# Altium footprint library 针式电感.PcbLib: 75 footprints (part 3 of 5)
Each footprint in its own frame and in the unit in brackets; x right, y up, seen from the top. Pads: shape width x height; smd on the part's side, far side on the other; paste and mask are expansions set on the pad; w line width, h text height; cw(c..) or ccw(c..) is an arc to the next point about the centre after c.
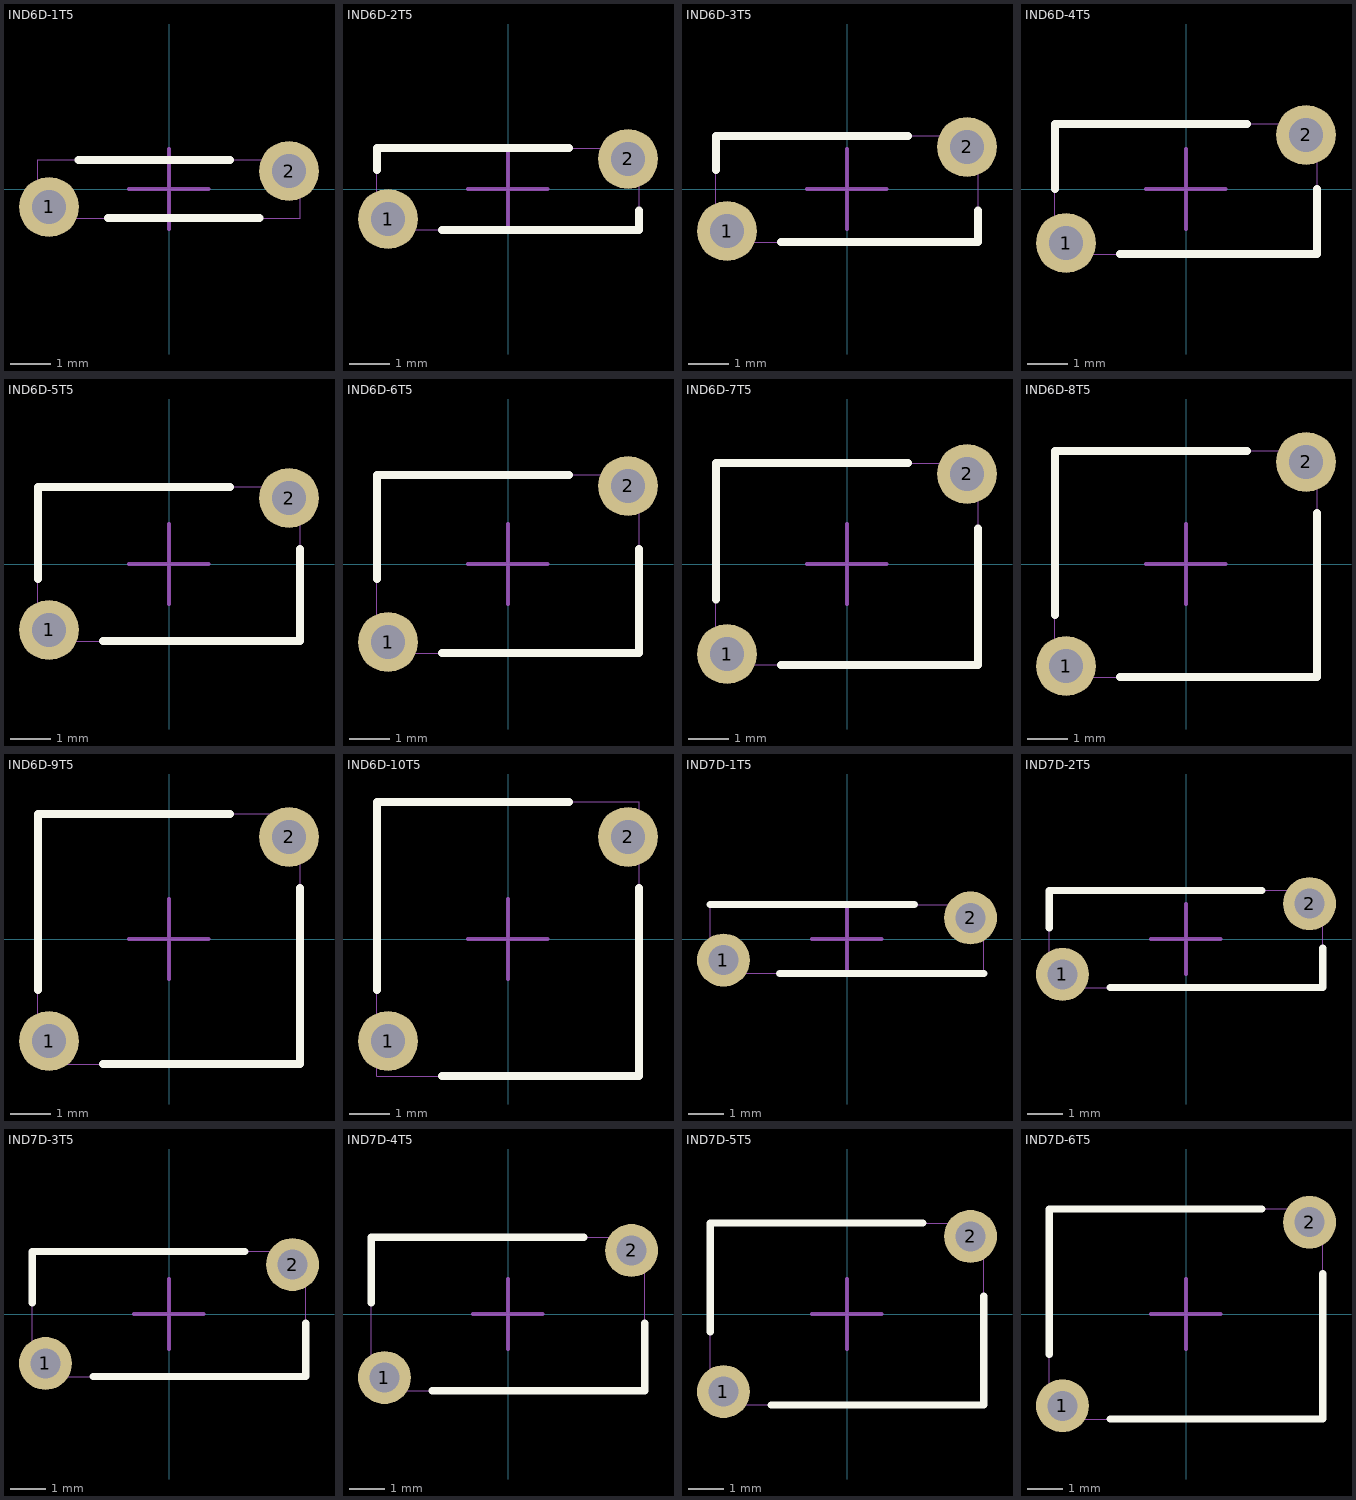
[diagram p2: the footprints below, top view; thin cyan lines are the x and y axes]

## IND6D-1T5 [mm] "空芯线圈"
height 6.8
pads (2):
  round 1.5 hole 0.85 unplated: 1(-3,-0.45) 2(3,0.45)
Top Overlay:
  lines w0.2: -2.264,0.725 1.524,0.725 ; -1.524,-0.725 2.264,-0.725
Mechanical 13:
  lines w0.01: -3.275,-0.725 3.275,-0.725 3.275,0.725 -3.275,0.725 -3.275,-0.725
Mechanical 15:
  lines w0.1: -1,0 0.991,0 ; 0,-1 0,1
3D body: height 6.77, standoff -2.5, extent -3.275,-0.725 3.275,0.725

## IND6D-2T5 [mm] "空芯线圈"
height 6.8
pads (2):
  round 1.5 hole 0.85 unplated: 1(-3,-0.75) 2(3,0.75)
Top Overlay:
  lines w0.2: -3.275,0.481 -3.275,1.025 1.524,1.025 ; -1.651,-1.025 3.275,-1.025 3.275,-0.535
Mechanical 13:
  lines w0.01: -3.275,-1.025 3.275,-1.025 3.275,1.025 -3.275,1.025 -3.275,-1.025
Mechanical 15:
  lines w0.1: -1,0 0.991,0 ; 0,-1 0,1
3D body: height 6.77, standoff -2.5, extent -3.275,-1.025 3.275,1.025

## IND6D-3T5 [mm] "空芯线圈"
height 6.8
pads (2):
  round 1.5 hole 0.85 unplated: 1(-3,-1.05) 2(3,1.05)
Top Overlay:
  lines w0.2: -3.275,0.481 -3.275,1.325 1.524,1.325 ; -1.651,-1.325 3.275,-1.325 3.275,-0.535
Mechanical 13:
  lines w0.01: -3.275,-1.325 -3.275,1.325 3.275,1.325 3.275,-1.325 -3.275,-1.325
Mechanical 15:
  lines w0.1: -1,0 0.991,0 ; 0,-1 0,1
3D body: height 6.78, standoff -2.5, extent -3.275,-1.325 3.275,1.325

## IND6D-4T5 [mm] "空芯线圈"
height 6.8
pads (2):
  round 1.5 hole 0.85 unplated: 1(-3,-1.35) 2(3,1.35)
Top Overlay:
  lines w0.2: -3.275,0 -3.275,1.625 1.524,1.625 ; -1.651,-1.625 3.275,-1.625 3.275,0
Mechanical 13:
  lines w0.01: -3.275,-1.625 -3.275,1.625 3.275,1.625 3.275,-1.625 -3.275,-1.625
Mechanical 15:
  lines w0.1: -1,0 0.991,0 ; 0,-1 0,1
3D body: height 6.78, standoff -2.5, extent -3.275,-1.625 3.275,1.625

## IND6D-5T5 [mm] "空芯线圈"
height 6.8
pads (2):
  round 1.5 hole 0.85 unplated: 1(-3,-1.65) 2(3,1.65)
Top Overlay:
  lines w0.2: -3.275,-0.381 -3.275,1.925 1.524,1.925 ; -1.651,-1.925 3.275,-1.925 3.275,0.381
Mechanical 13:
  lines w0.01: -3.275,-1.925 3.275,-1.925 3.275,1.925 -3.275,1.925 -3.275,-1.925
Mechanical 15:
  lines w0.1: -1,0 0.991,0 ; 0,-1 0,1
3D body: height 6.78, standoff -2.5, extent -3.275,-1.925 3.275,1.925

## IND6D-6T5 [mm] "空芯线圈"
height 6.8
pads (2):
  round 1.5 hole 0.85 unplated: 1(-3,-1.95) 2(3,1.95)
Top Overlay:
  lines w0.2: -3.275,-0.381 -3.275,2.225 1.524,2.225 ; -1.651,-2.225 3.275,-2.225 3.275,0.381
Mechanical 13:
  lines w0.01: -3.275,-2.225 3.275,-2.225 3.275,2.225 -3.275,2.225 -3.275,-2.225
Mechanical 15:
  lines w0.1: -1,0 0.991,0 ; 0,-1 0,1
3D body: height 6.78, standoff -2.5, extent -3.275,-2.225 3.275,2.225

## IND6D-7T5 [mm] "空芯线圈"
height 6.8
pads (2):
  round 1.5 hole 0.85 unplated: 1(-3,-2.25) 2(3,2.25)
Top Overlay:
  lines w0.2: -3.275,-0.889 -3.275,2.525 1.524,2.525 ; -1.651,-2.525 3.275,-2.525 3.275,0.889
Mechanical 13:
  lines w0.01: -3.275,-2.525 -3.275,2.525 3.275,2.525 3.275,-2.525 -3.275,-2.525
Mechanical 15:
  lines w0.1: -1,0 0.991,0 ; 0,-1 0,1
3D body: height 6.77, standoff -2.5, extent -3.275,-2.525 3.275,2.525

## IND6D-8T5 [mm] "空芯线圈"
height 6.8
pads (2):
  round 1.5 hole 0.85 unplated: 1(-3,-2.55) 2(3,2.55)
Top Overlay:
  lines w0.2: -3.275,-1.27 -3.275,2.825 1.524,2.825 ; -1.651,-2.825 3.275,-2.825 3.275,1.27
Mechanical 13:
  lines w0.01: -3.275,-2.825 -3.275,2.825 3.275,2.825 3.275,-2.825 -3.275,-2.825
Mechanical 15:
  lines w0.1: -1,0 0.991,0 ; 0,-1 0,1
3D body: height 6.77, standoff -2.5, extent -3.275,-2.825 3.275,2.825

## IND6D-9T5 [mm] "空芯线圈"
height 6.8
pads (2):
  round 1.5 hole 0.85 unplated: 1(-3,-2.55) 2(3,2.55)
Top Overlay:
  lines w0.2: -3.275,-1.27 -3.275,3.125 1.524,3.125 ; -1.651,-3.125 3.275,-3.125 3.275,1.27
Mechanical 13:
  lines w0.01: -3.275,-3.125 -3.275,3.125 3.275,3.125 3.275,-3.125 -3.275,-3.125
Mechanical 15:
  lines w0.1: -1,0 0.991,0 ; 0,-1 0,1
3D body: height 6.77, standoff -2.5, extent -3.275,-3.125 3.275,3.125

## IND6D-10T5 [mm] "空芯线圈"
height 6.8
pads (2):
  round 1.5 hole 0.85 unplated: 1(-3,-2.55) 2(3,2.55)
Top Overlay:
  lines w0.2: -3.275,-1.27 -3.275,3.425 1.524,3.425 ; -1.651,-3.425 3.275,-3.425 3.275,1.27
Mechanical 13:
  lines w0.01: -3.275,-3.425 -3.275,3.425 3.275,3.425 3.275,-3.425 -3.275,-3.425
Mechanical 15:
  lines w0.1: -1,0 0.991,0 ; 0,-1 0,1
3D body: height 6.78, standoff -2.5, extent -3.275,-3.425 3.275,3.425

## IND7D-1T5 [mm] "空芯线圈"
height 6.8
pads (2):
  round 1.5 hole 0.85 unplated: 1(-3.5,-0.6) 2(3.5,0.6)
Top Overlay:
  lines w0.2: -3.875,0.975 1.905,0.975 ; -1.905,-0.975 3.875,-0.975
Mechanical 13:
  lines w0.01: -3.875,-0.975 -3.875,0.975 3.875,0.975 3.875,-0.975 -3.875,-0.975
Mechanical 15:
  lines w0.1: -1,0 0.991,0 ; 0,-1 0,1
3D body: height 8.12, standoff -2.76, extent -3.875,-0.975 3.875,0.975

## IND7D-2T5 [mm] "空芯线圈"
height 6.8
pads (2):
  round 1.5 hole 0.85 unplated: 1(-3.5,-1) 2(3.5,1)
Top Overlay:
  lines w0.2: -3.875,0.319 -3.875,1.375 2.159,1.375 ; -2.159,-1.375 3.875,-1.375 3.875,-0.254
Mechanical 13:
  lines w0.01: -3.875,-1.375 -3.875,1.375 3.875,1.375 3.875,-1.375 -3.875,-1.375
Mechanical 15:
  lines w0.1: -1,0 0.991,0 ; 0,-1 0,1
3D body: height 8.12, standoff -2.76, extent -3.875,-1.375 3.875,1.375

## IND7D-3T5 [mm] "空芯线圈"
height 6.8
pads (2):
  round 1.5 hole 0.85 unplated: 1(-3.5,-1.4) 2(3.5,1.4)
Top Overlay:
  lines w0.2: -3.875,0.319 -3.875,1.775 2.159,1.775 ; -2.159,-1.775 3.875,-1.775 3.875,-0.254
Mechanical 13:
  lines w0.01: -3.875,-1.775 3.875,-1.775 3.875,1.775 -3.875,1.775 -3.875,-1.775
Mechanical 15:
  lines w0.1: -1,0 0.991,0 ; 0,-1 0,1
3D body: height 8.12, standoff -2.76, extent -3.875,-1.775 3.875,1.775

## IND7D-4T5 [mm] "空芯线圈"
height 6.8
pads (2):
  round 1.5 hole 0.85 unplated: 1(-3.5,-1.8) 2(3.5,1.8)
Top Overlay:
  lines w0.2: -3.875,0.319 -3.875,2.175 2.159,2.175 ; -2.159,-2.175 3.875,-2.175 3.875,-0.254
Mechanical 13:
  lines w0.01: -3.875,-2.175 -3.875,2.175 3.875,2.175 3.875,-2.175 -3.875,-2.175
Mechanical 15:
  lines w0.1: -1,0 0.991,0 ; 0,-1 0,1
3D body: height 8.13, standoff -2.76, extent -3.875,-2.175 3.875,2.175

## IND7D-5T5 [mm] "空芯线圈"
height 6.8
pads (2):
  round 1.5 hole 0.85 unplated: 1(-3.5,-2.2) 2(3.5,2.2)
Top Overlay:
  lines w0.2: -3.875,-0.508 -3.875,2.575 2.159,2.575 ; -2.159,-2.575 3.875,-2.575 3.875,0.508
Mechanical 13:
  lines w0.01: -3.875,-2.575 -3.875,2.575 3.875,2.575 3.875,-2.575 -3.875,-2.575
Mechanical 15:
  lines w0.1: -1,0 0.991,0 ; 0,-1 0,1
3D body: height 8.12, standoff -2.76, extent -3.875,-2.575 3.875,2.575

## IND7D-6T5 [mm] "空芯线圈"
height 6.8
pads (2):
  round 1.5 hole 0.85 unplated: 1(-3.5,-2.6) 2(3.5,2.6)
Top Overlay:
  lines w0.2: -3.875,-1.143 -3.875,2.975 2.159,2.975 ; -2.159,-2.975 3.875,-2.975 3.875,1.143
Mechanical 13:
  lines w0.01: -3.875,-2.975 3.875,-2.975 3.875,2.975 -3.875,2.975 -3.875,-2.975
Mechanical 15:
  lines w0.1: -1,0 0.991,0 ; 0,-1 0,1
3D body: height 8.13, standoff -2.76, extent -3.875,-2.975 3.875,2.975